# Altium footprint library NES-Footprints.PcbLib: 92 footprints (part 6 of 6)
Each footprint in its own frame and in the unit in brackets; x right, y up, seen from the top. Pads: shape width x height; smd on the part's side, far side on the other; paste and mask are expansions set on the pad; w line width, h text height; cw(c..) or ccw(c..) is an arc to the next point about the centre after c.
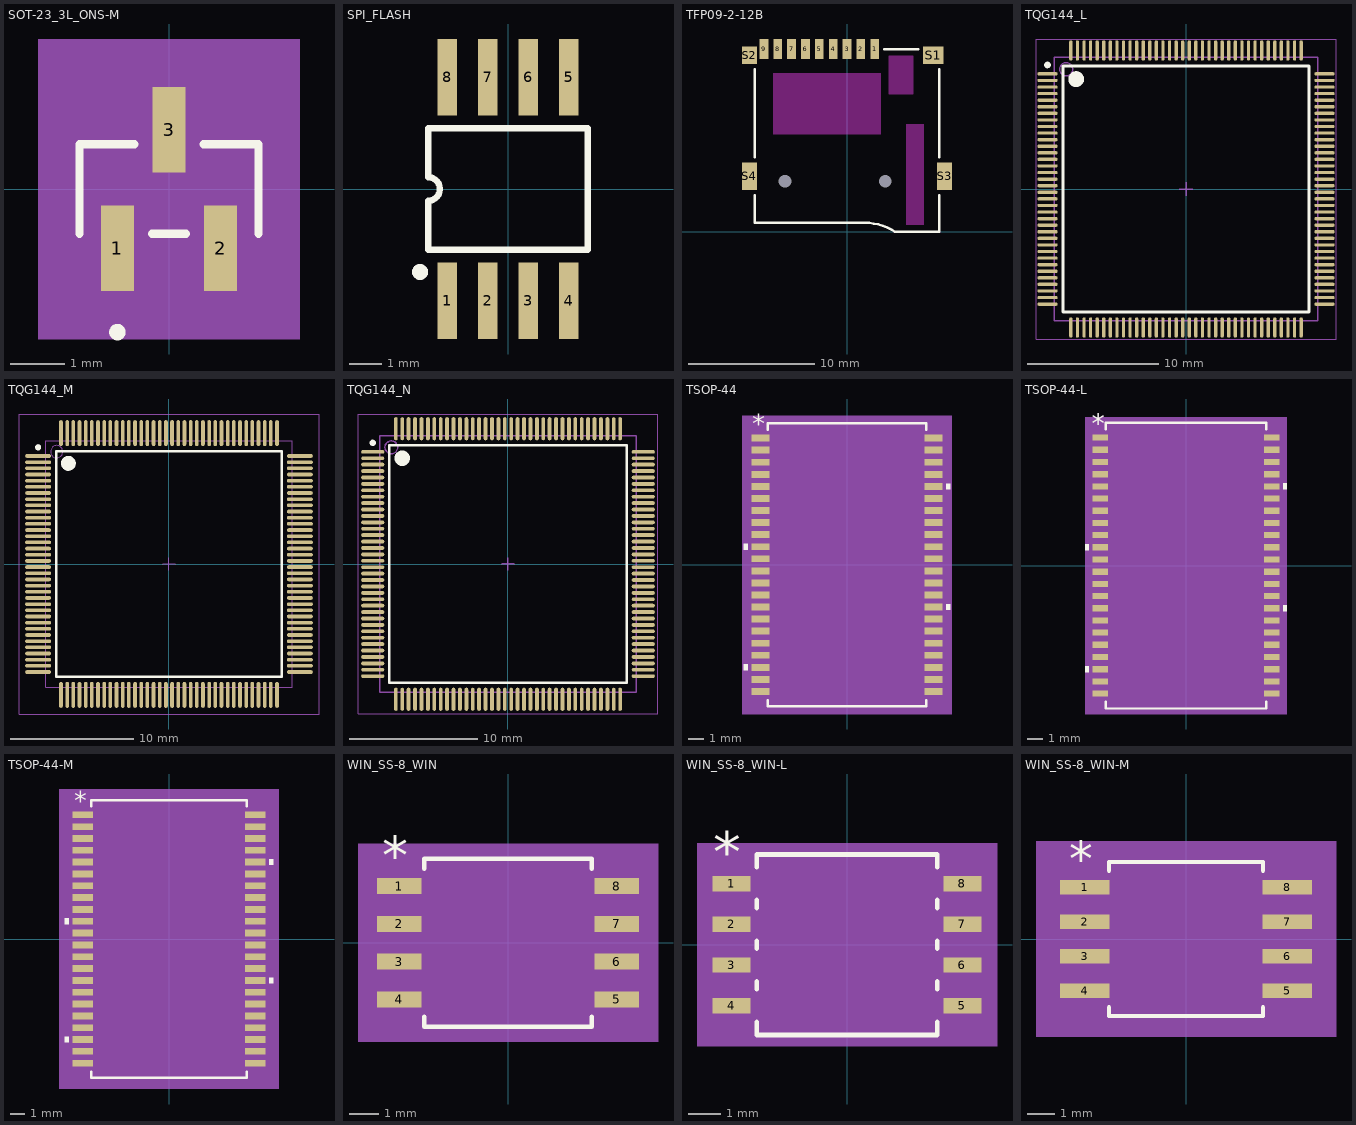
[diagram p5: the footprints below, top view; thin cyan lines are the x and y axes]

## SOT-23_3L_ONS-M [mil]
pads (3):
  rect 24x62 smd paste+0 mask+0: 1(-37.5,-43) 2(37.5,-43) 3(0,43)
Top Overlay:
  circle w6: c-37.5,-104 r3
  lines w6: -65,-32.5 -65,32.5 -25.1,32.5 ; -12.4,-32.5 12.4,-32.5 ; 25.1,32.5 65,32.5 65,-32.5
Mechanical 5:
  region: -95,109 95,109 95,-109 -95,-109
Mechanical 13:
  circle w0: c-37.5,-17.5 r3
  lines w1: -60,-27.5 -60,27.5 60,27.5 60,-27.5 -60,-27.5 ; -47.5,-52 -27.5,-52 -27.5,-27.5 -47.5,-27.5 -47.5,-52 ; -10,27.5 -10,52 10,52 10,27.5 -10,27.5 ; 27.5,-52 47.5,-52 47.5,-27.5 27.5,-27.5 27.5,-52
Mechanical 15:
  region: -80,-47.5 -80,47.5 -30,47.5 -30,94 30,94 30,47.5 80,47.5 80,-47.5 67.5,-47.5 67.5,-94 -67.5,-94 -67.5,-47.5
  lines w6: -80,-47.5 -67.5,-47.5 -67.5,-94 67.5,-94 67.5,-47.5 80,-47.5 80,47.5 30,47.5 30,94 -30,94 -30,47.5 -80,47.5 -80,-47.5
3D body "SOT-23_3L_ONS.step": height 44.09, standoff 0, extent -60,-52.01 60,52.01

## SPI_FLASH [mm] "Small Outline; 8 Leads; Body Width 3.9 mm; Pitch 1.27 mm"
height 1.75
pads (8):
  rect 0.6x2.4 smd: 1(-1.905,-3.5) 2(-0.635,-3.5) 3(0.635,-3.5) 4(1.905,-3.5) 5(1.905,3.5) 6(0.635,3.5) 7(-0.635,3.5) 8(-1.905,3.5)
Top Overlay:
  circle w0.25: c-2.755,-2.6 r0.125
  lines w0.2: -2.5,-1.9 2.5,-1.9 2.5,1.9 -2.5,1.9 -2.5,0.367 cw(c-2.5,0) -2.5,-0.367 -2.5,-1.9

## TFP09-2-12B [mm] "MicroSD card socket"
pads (15):
  rect 0.7x1.6 smd: 1(2.2,14.5) 2(1.1,14.5) 3(0,14.5) 4(-1.1,14.5) 5(-2.2,14.5) 6(-3.3,14.5) 7(-4.4,14.5) 8(-5.5,14.5) 9(-6.6,14.5)
  rect 0x0 hole 1 unplated: MH1(3.05,4) MH2(-4.93,4)
  rect 1.6x1.4 smd: S1(6.85,14)
  rect 1.2x1.4 smd: S2(-7.75,14)
  rect 1.2x2.2 smd: S3(7.75,4.4) S4(-7.75,4.4)
Top Layer keep-out:
  rectangle: -5.9,7.7 2.7,12.6
  rectangle: 3.3,10.9 5.3,14
  rectangle: 4.7,0.5 6.1,8.55
Top Overlay:
  lines w0.2: -7.35,2.9 -7.35,0.7 1,0.7 1.405,0.7 cw(c1.354,-3.92) 3.8,0 7.35,0 7.35,2.9 ; -7.35,5.9 -7.35,12.9 ; 2.95,14.5 5.65,14.5 ; 7.35,5.9 7.35,12.9
3D body "XKXFS-N02-XXT.STEP": height 1.86, standoff -0.54, extent -8.2,0 8.2,15

## TQG144_L [mm] "Thin QFP, 144-Leads, Body 20x20mm, Pitch 0.5mm, IPC High Density"
height 1.6
pads (144):
  oval 1.55x0.25 smd: 1(-10.525,8.75) 2(-10.525,8.25) 3(-10.525,7.75) 4(-10.525,7.25) 5(-10.525,6.75) 6(-10.525,6.25) 7(-10.525,5.75) 8(-10.525,5.25) 9(-10.525,4.75) 10(-10.525,4.25) 11(-10.525,3.75) 12(-10.525,3.25) 13(-10.525,2.75) 14(-10.525,2.25) 15(-10.525,1.75) 16(-10.525,1.25) 17(-10.525,0.75) 18(-10.525,0.25) 19(-10.525,-0.25) 20(-10.525,-0.75) 21(-10.525,-1.25) 22(-10.525,-1.75) 23(-10.525,-2.25) 24(-10.525,-2.75) 25(-10.525,-3.25) 26(-10.525,-3.75) 27(-10.525,-4.25) 28(-10.525,-4.75) 29(-10.525,-5.25) 30(-10.525,-5.75) 31(-10.525,-6.25) 32(-10.525,-6.75) 33(-10.525,-7.25) 34(-10.525,-7.75) 35(-10.525,-8.25) 36(-10.525,-8.75) 73(10.525,-8.75) 74(10.525,-8.25) 75(10.525,-7.75) 76(10.525,-7.25) 77(10.525,-6.75) 78(10.525,-6.25) 79(10.525,-5.75) 80(10.525,-5.25) 81(10.525,-4.75) 82(10.525,-4.25) 83(10.525,-3.75) 84(10.525,-3.25) 85(10.525,-2.75) 86(10.525,-2.25) 87(10.525,-1.75) 88(10.525,-1.25) 89(10.525,-0.75) 90(10.525,-0.25) 91(10.525,0.25) 92(10.525,0.75) 93(10.525,1.25) 94(10.525,1.75) 95(10.525,2.25) 96(10.525,2.75) 97(10.525,3.25) 98(10.525,3.75) 99(10.525,4.25) 100(10.525,4.75) 101(10.525,5.25) 102(10.525,5.75) 103(10.525,6.25) 104(10.525,6.75) 105(10.525,7.25) 106(10.525,7.75) 107(10.525,8.25) 108(10.525,8.75)
  oval 0.25x1.55 smd: 37(-8.75,-10.525) 38(-8.25,-10.525) 39(-7.75,-10.525) 40(-7.25,-10.525) 41(-6.75,-10.525) 42(-6.25,-10.525) 43(-5.75,-10.525) 44(-5.25,-10.525) 45(-4.75,-10.525) 46(-4.25,-10.525) 47(-3.75,-10.525) 48(-3.25,-10.525) 49(-2.75,-10.525) 50(-2.25,-10.525) 51(-1.75,-10.525) 52(-1.25,-10.525) 53(-0.75,-10.525) 54(-0.25,-10.525) 55(0.25,-10.525) 56(0.75,-10.525) 57(1.25,-10.525) 58(1.75,-10.525) 59(2.25,-10.525) 60(2.75,-10.525) 61(3.25,-10.525) 62(3.75,-10.525) 63(4.25,-10.525) 64(4.75,-10.525) 65(5.25,-10.525) 66(5.75,-10.525) 67(6.25,-10.525) 68(6.75,-10.525) 69(7.25,-10.525) 70(7.75,-10.525) 71(8.25,-10.525) 72(8.75,-10.525) 109(8.75,10.525) 110(8.25,10.525) 111(7.75,10.525) 112(7.25,10.525) 113(6.75,10.525) 114(6.25,10.525) 115(5.75,10.525) 116(5.25,10.525) 117(4.75,10.525) 118(4.25,10.525) 119(3.75,10.525) 120(3.25,10.525) 121(2.75,10.525) 122(2.25,10.525) 123(1.75,10.525) 124(1.25,10.525) 125(0.75,10.525) 126(0.25,10.525) 127(-0.25,10.525) 128(-0.75,10.525) 129(-1.25,10.525) 130(-1.75,10.525) 131(-2.25,10.525) 132(-2.75,10.525) 133(-3.25,10.525) 134(-3.75,10.525) 135(-4.25,10.525) 136(-4.75,10.525) 137(-5.25,10.525) 138(-5.75,10.525) 139(-6.25,10.525) 140(-6.75,10.525) 141(-7.25,10.525) 142(-7.75,10.525) 143(-8.25,10.525) 144(-8.75,10.525)
Top Overlay:
  circle w0.25: c-10.525,9.425 r0.125
  circle w0.6: c-8.35,8.35 r0.3
  lines w0.2: -9.35,-9.35 -9.35,9.35 9.35,9.35 9.35,-9.35 -9.35,-9.35
Mechanical 13:
  circle w0.1: c-9.1,9.1 r0.5
  lines w0.1: -10,-10 -10,10 10,10 10,-10 -10,-10
Mechanical 15:
  lines w0.05: -11.4,-11.4 -11.4,11.4 11.4,11.4 11.4,-11.4 -11.4,-11.4
  lines w0.1: -0.5,0 0.5,0 ; 0,-0.5 0,0.5
3D body: height 1.6, standoff 0, extent -10,-10 10,10

## TQG144_M [mm] "Thin QFP, 144-Leads, Body 20x20mm, Pitch 0.5mm, IPC Low Density"
height 1.6
pads (144):
  oval 2.1x0.3 smd: 1(-10.6,8.75) 2(-10.6,8.25) 3(-10.6,7.75) 4(-10.6,7.25) 5(-10.6,6.75) 6(-10.6,6.25) 7(-10.6,5.75) 8(-10.6,5.25) 9(-10.6,4.75) 10(-10.6,4.25) 11(-10.6,3.75) 12(-10.6,3.25) 13(-10.6,2.75) 14(-10.6,2.25) 15(-10.6,1.75) 16(-10.6,1.25) 17(-10.6,0.75) 18(-10.6,0.25) 19(-10.6,-0.25) 20(-10.6,-0.75) 21(-10.6,-1.25) 22(-10.6,-1.75) 23(-10.6,-2.25) 24(-10.6,-2.75) 25(-10.6,-3.25) 26(-10.6,-3.75) 27(-10.6,-4.25) 28(-10.6,-4.75) 29(-10.6,-5.25) 30(-10.6,-5.75) 31(-10.6,-6.25) 32(-10.6,-6.75) 33(-10.6,-7.25) 34(-10.6,-7.75) 35(-10.6,-8.25) 36(-10.6,-8.75) 73(10.6,-8.75) 74(10.6,-8.25) 75(10.6,-7.75) 76(10.6,-7.25) 77(10.6,-6.75) 78(10.6,-6.25) 79(10.6,-5.75) 80(10.6,-5.25) 81(10.6,-4.75) 82(10.6,-4.25) 83(10.6,-3.75) 84(10.6,-3.25) 85(10.6,-2.75) 86(10.6,-2.25) 87(10.6,-1.75) 88(10.6,-1.25) 89(10.6,-0.75) 90(10.6,-0.25) 91(10.6,0.25) 92(10.6,0.75) 93(10.6,1.25) 94(10.6,1.75) 95(10.6,2.25) 96(10.6,2.75) 97(10.6,3.25) 98(10.6,3.75) 99(10.6,4.25) 100(10.6,4.75) 101(10.6,5.25) 102(10.6,5.75) 103(10.6,6.25) 104(10.6,6.75) 105(10.6,7.25) 106(10.6,7.75) 107(10.6,8.25) 108(10.6,8.75)
  oval 0.3x2.1 smd: 37(-8.75,-10.6) 38(-8.25,-10.6) 39(-7.75,-10.6) 40(-7.25,-10.6) 41(-6.75,-10.6) 42(-6.25,-10.6) 43(-5.75,-10.6) 44(-5.25,-10.6) 45(-4.75,-10.6) 46(-4.25,-10.6) 47(-3.75,-10.6) 48(-3.25,-10.6) 49(-2.75,-10.6) 50(-2.25,-10.6) 51(-1.75,-10.6) 52(-1.25,-10.6) 53(-0.75,-10.6) 54(-0.25,-10.6) 55(0.25,-10.6) 56(0.75,-10.6) 57(1.25,-10.6) 58(1.75,-10.6) 59(2.25,-10.6) 60(2.75,-10.6) 61(3.25,-10.6) 62(3.75,-10.6) 63(4.25,-10.6) 64(4.75,-10.6) 65(5.25,-10.6) 66(5.75,-10.6) 67(6.25,-10.6) 68(6.75,-10.6) 69(7.25,-10.6) 70(7.75,-10.6) 71(8.25,-10.6) 72(8.75,-10.6) 109(8.75,10.6) 110(8.25,10.6) 111(7.75,10.6) 112(7.25,10.6) 113(6.75,10.6) 114(6.25,10.6) 115(5.75,10.6) 116(5.25,10.6) 117(4.75,10.6) 118(4.25,10.6) 119(3.75,10.6) 120(3.25,10.6) 121(2.75,10.6) 122(2.25,10.6) 123(1.75,10.6) 124(1.25,10.6) 125(0.75,10.6) 126(0.25,10.6) 127(-0.25,10.6) 128(-0.75,10.6) 129(-1.25,10.6) 130(-1.75,10.6) 131(-2.25,10.6) 132(-2.75,10.6) 133(-3.25,10.6) 134(-3.75,10.6) 135(-4.25,10.6) 136(-4.75,10.6) 137(-5.25,10.6) 138(-5.75,10.6) 139(-6.25,10.6) 140(-6.75,10.6) 141(-7.25,10.6) 142(-7.75,10.6) 143(-8.25,10.6) 144(-8.75,10.6)
Top Overlay:
  circle w0.25: c-10.6,9.45 r0.125
  circle w0.6: c-8.15,8.15 r0.3
  lines w0.2: -9.15,-9.15 -9.15,9.15 9.15,9.15 9.15,-9.15 -9.15,-9.15
Mechanical 13:
  circle w0.1: c-9.1,9.1 r0.5
  lines w0.1: -10,-10 -10,10 10,10 10,-10 -10,-10
Mechanical 15:
  lines w0.05: -12.15,-12.15 -12.15,12.15 12.15,12.15 12.15,-12.15 -12.15,-12.15
  lines w0.1: -0.5,0 0.5,0 ; 0,-0.5 0,0.5
3D body: height 1.6, standoff 0, extent -10,-10 10,10

## TQG144_N [mm] "Thin QFP, 144-Leads, Body 20x20mm, Pitch 0.5mm, IPC Medium Density"
height 1.6
pads (144):
  oval 1.8x0.3 smd: 1(-10.55,8.75) 2(-10.55,8.25) 3(-10.55,7.75) 4(-10.55,7.25) 5(-10.55,6.75) 6(-10.55,6.25) 7(-10.55,5.75) 8(-10.55,5.25) 9(-10.55,4.75) 10(-10.55,4.25) 11(-10.55,3.75) 12(-10.55,3.25) 13(-10.55,2.75) 14(-10.55,2.25) 15(-10.55,1.75) 16(-10.55,1.25) 17(-10.55,0.75) 18(-10.55,0.25) 19(-10.55,-0.25) 20(-10.55,-0.75) 21(-10.55,-1.25) 22(-10.55,-1.75) 23(-10.55,-2.25) 24(-10.55,-2.75) 25(-10.55,-3.25) 26(-10.55,-3.75) 27(-10.55,-4.25) 28(-10.55,-4.75) 29(-10.55,-5.25) 30(-10.55,-5.75) 31(-10.55,-6.25) 32(-10.55,-6.75) 33(-10.55,-7.25) 34(-10.55,-7.75) 35(-10.55,-8.25) 36(-10.55,-8.75) 73(10.55,-8.75) 74(10.55,-8.25) 75(10.55,-7.75) 76(10.55,-7.25) 77(10.55,-6.75) 78(10.55,-6.25) 79(10.55,-5.75) 80(10.55,-5.25) 81(10.55,-4.75) 82(10.55,-4.25) 83(10.55,-3.75) 84(10.55,-3.25) 85(10.55,-2.75) 86(10.55,-2.25) 87(10.55,-1.75) 88(10.55,-1.25) 89(10.55,-0.75) 90(10.55,-0.25) 91(10.55,0.25) 92(10.55,0.75) 93(10.55,1.25) 94(10.55,1.75) 95(10.55,2.25) 96(10.55,2.75) 97(10.55,3.25) 98(10.55,3.75) 99(10.55,4.25) 100(10.55,4.75) 101(10.55,5.25) 102(10.55,5.75) 103(10.55,6.25) 104(10.55,6.75) 105(10.55,7.25) 106(10.55,7.75) 107(10.55,8.25) 108(10.55,8.75)
  oval 0.3x1.8 smd: 37(-8.75,-10.55) 38(-8.25,-10.55) 39(-7.75,-10.55) 40(-7.25,-10.55) 41(-6.75,-10.55) 42(-6.25,-10.55) 43(-5.75,-10.55) 44(-5.25,-10.55) 45(-4.75,-10.55) 46(-4.25,-10.55) 47(-3.75,-10.55) 48(-3.25,-10.55) 49(-2.75,-10.55) 50(-2.25,-10.55) 51(-1.75,-10.55) 52(-1.25,-10.55) 53(-0.75,-10.55) 54(-0.25,-10.55) 55(0.25,-10.55) 56(0.75,-10.55) 57(1.25,-10.55) 58(1.75,-10.55) 59(2.25,-10.55) 60(2.75,-10.55) 61(3.25,-10.55) 62(3.75,-10.55) 63(4.25,-10.55) 64(4.75,-10.55) 65(5.25,-10.55) 66(5.75,-10.55) 67(6.25,-10.55) 68(6.75,-10.55) 69(7.25,-10.55) 70(7.75,-10.55) 71(8.25,-10.55) 72(8.75,-10.55) 109(8.75,10.55) 110(8.25,10.55) 111(7.75,10.55) 112(7.25,10.55) 113(6.75,10.55) 114(6.25,10.55) 115(5.75,10.55) 116(5.25,10.55) 117(4.75,10.55) 118(4.25,10.55) 119(3.75,10.55) 120(3.25,10.55) 121(2.75,10.55) 122(2.25,10.55) 123(1.75,10.55) 124(1.25,10.55) 125(0.75,10.55) 126(0.25,10.55) 127(-0.25,10.55) 128(-0.75,10.55) 129(-1.25,10.55) 130(-1.75,10.55) 131(-2.25,10.55) 132(-2.75,10.55) 133(-3.25,10.55) 134(-3.75,10.55) 135(-4.25,10.55) 136(-4.75,10.55) 137(-5.25,10.55) 138(-5.75,10.55) 139(-6.25,10.55) 140(-6.75,10.55) 141(-7.25,10.55) 142(-7.75,10.55) 143(-8.25,10.55) 144(-8.75,10.55)
Top Overlay:
  circle w0.25: c-10.55,9.45 r0.125
  circle w0.6: c-8.25,8.25 r0.3
  lines w0.2: -9.25,-9.25 -9.25,9.25 9.25,9.25 9.25,-9.25 -9.25,-9.25
Mechanical 13:
  circle w0.1: c-9.1,9.1 r0.5
  lines w0.1: -10,-10 -10,10 10,10 10,-10 -10,-10
Mechanical 15:
  lines w0.05: -11.7,-11.7 -11.7,11.7 11.7,11.7 11.7,-11.7 -11.7,-11.7
  lines w0.1: -0.5,0 0.5,0 ; 0,-0.5 0,0.5
3D body: height 1.6, standoff 0, extent -10,-10 10,10

## TSOP-44 [mil]
pads (44):
  rect 47x18 smd paste+0 mask+0: 1(-225.5,330.75) 2(-225.5,299.25) 3(-225.5,267.75) 4(-225.5,236.25) 5(-225.5,204.75) 6(-225.5,173.25) 7(-225.5,141.75) 8(-225.5,110.25) 9(-225.5,78.75) 10(-225.5,47.25) 11(-225.5,15.75) 12(-225.5,-15.75) 13(-225.5,-47.25) 14(-225.5,-78.75) 15(-225.5,-110.25) 16(-225.5,-141.75) 17(-225.5,-173.25) 18(-225.5,-204.75) 19(-225.5,-236.25) 20(-225.5,-267.75) 21(-225.5,-299.25) 22(-225.5,-330.75) 23(225.5,-330.75) 24(225.5,-299.25) 25(225.5,-267.75) 26(225.5,-236.25) 27(225.5,-204.75) 28(225.5,-173.25) 29(225.5,-141.75) 30(225.5,-110.25) 31(225.5,-78.75) 32(225.5,-47.25) 33(225.5,-15.75) 34(225.5,15.75) 35(225.5,47.25) 36(225.5,78.75) 37(225.5,110.25) 38(225.5,141.75) 39(225.5,173.25) 40(225.5,204.75) 41(225.5,236.25) 42(225.5,267.75) 43(225.5,299.25) 44(225.5,330.75)
Top Overlay:
  region: 259,212.25 269,212.25 269,197.25 259,197.25
  region: 259,-102.75 269,-102.75 269,-117.75 259,-117.75
  region: -259,-260.25 -269,-260.25 -269,-275.25 -259,-275.25
  region: -259,54.75 -269,54.75 -269,39.75 -259,39.75
  lines w6: -207,-352.85 -207,-369.5 207,-369.5 207,-352.85 ; -207,352.85 -207,369.5 207,369.5 207,352.85
  text "*" at -248,343.75 h50
Mechanical 5:
  region: 274,-389.5 -274,-389.5 -274,389.5 274,389.5
Mechanical 13:
  drawing of 181 lines, arcs and shapes, not listed
  text "*" at -199.5,311.5 h50
Mechanical 15:
  region: -212,-349.75 -259,-349.75 -259,349.75 -212,349.75 -212,374.5 212,374.5 212,349.75 259,349.75 259,-349.75 212,-349.75 212,-374.5 -212,-374.5
  lines w6: -259,-349.75 -212,-349.75 -212,-374.5 212,-374.5 212,-349.75 259,-349.75 259,349.75 212,349.75 212,374.5 -212,374.5 -212,349.75 -259,349.75 -259,-349.75
3D body "TSOP-44.step": height 47.09, standoff 0, extent -235,-364.49 235,364.49

## TSOP-44-L [mil]
pads (44):
  rect 39x16 smd paste+0 mask+0: 1(-221.5,330.75) 2(-221.5,299.25) 3(-221.5,267.75) 4(-221.5,236.25) 5(-221.5,204.75) 6(-221.5,173.25) 7(-221.5,141.75) 8(-221.5,110.25) 9(-221.5,78.75) 10(-221.5,47.25) 11(-221.5,15.75) 12(-221.5,-15.75) 13(-221.5,-47.25) 14(-221.5,-78.75) 15(-221.5,-110.25) 16(-221.5,-141.75) 17(-221.5,-173.25) 18(-221.5,-204.75) 19(-221.5,-236.25) 20(-221.5,-267.75) 21(-221.5,-299.25) 22(-221.5,-330.75) 23(221.5,-330.75) 24(221.5,-299.25) 25(221.5,-267.75) 26(221.5,-236.25) 27(221.5,-204.75) 28(221.5,-173.25) 29(221.5,-141.75) 30(221.5,-110.25) 31(221.5,-78.75) 32(221.5,-47.25) 33(221.5,-15.75) 34(221.5,15.75) 35(221.5,47.25) 36(221.5,78.75) 37(221.5,110.25) 38(221.5,141.75) 39(221.5,173.25) 40(221.5,204.75) 41(221.5,236.25) 42(221.5,267.75) 43(221.5,299.25) 44(221.5,330.75)
Top Overlay:
  region: -251,54.75 -261,54.75 -261,39.75 -251,39.75
  region: -251,-260.25 -261,-260.25 -261,-275.25 -251,-275.25
  region: 251,-102.75 261,-102.75 261,-117.75 251,-117.75
  region: 251,212.25 261,212.25 261,197.25 251,197.25
  lines w6: -207,-351.85 -207,-369.5 207,-369.5 207,-351.85 ; -207,351.85 -207,369.5 207,369.5 207,351.85
  text "*" at -244,341.75 h50
Mechanical 5:
  region: 260,-383.5 -260,-383.5 -260,383.5 260,383.5
Mechanical 13:
  drawing of 181 lines, arcs and shapes, not listed
  text "*" at -199.5,311.5 h50
Mechanical 15:
  region: -206,-342.75 -245,-342.75 -245,342.75 -206,342.75 -206,368.5 206,368.5 206,342.75 245,342.75 245,-342.75 206,-342.75 206,-368.5 -206,-368.5
  lines w6: -245,-342.75 -245,342.75 -206,342.75 -206,368.5 206,368.5 206,342.75 245,342.75 245,-342.75 206,-342.75 206,-368.5 -206,-368.5 -206,-342.75 -245,-342.75
3D body "TSOP-44.step": height 47.09, standoff 0, extent -235,-364.49 235,364.49

## TSOP-44-M [mil]
pads (44):
  rect 55x18 smd paste+0 mask+0: 1(-229.5,330.75) 2(-229.5,299.25) 3(-229.5,267.75) 4(-229.5,236.25) 5(-229.5,204.75) 6(-229.5,173.25) 7(-229.5,141.75) 8(-229.5,110.25) 9(-229.5,78.75) 10(-229.5,47.25) 11(-229.5,15.75) 12(-229.5,-15.75) 13(-229.5,-47.25) 14(-229.5,-78.75) 15(-229.5,-110.25) 16(-229.5,-141.75) 17(-229.5,-173.25) 18(-229.5,-204.75) 19(-229.5,-236.25) 20(-229.5,-267.75) 21(-229.5,-299.25) 22(-229.5,-330.75) 23(229.5,-330.75) 24(229.5,-299.25) 25(229.5,-267.75) 26(229.5,-236.25) 27(229.5,-204.75) 28(229.5,-173.25) 29(229.5,-141.75) 30(229.5,-110.25) 31(229.5,-78.75) 32(229.5,-47.25) 33(229.5,-15.75) 34(229.5,15.75) 35(229.5,47.25) 36(229.5,78.75) 37(229.5,110.25) 38(229.5,141.75) 39(229.5,173.25) 40(229.5,204.75) 41(229.5,236.25) 42(229.5,267.75) 43(229.5,299.25) 44(229.5,330.75)
Top Overlay:
  region: 267,212.25 277,212.25 277,197.25 267,197.25
  region: 267,-102.75 277,-102.75 277,-117.75 267,-117.75
  region: -267,-260.25 -277,-260.25 -277,-275.25 -267,-275.25
  region: -267,54.75 -277,54.75 -277,39.75 -267,39.75
  lines w6: -207,-352.85 -207,-369.5 207,-369.5 207,-352.85 ; -207,352.85 -207,369.5 207,369.5 207,352.85
  text "*" at -252,343.75 h50
Mechanical 5:
  region: 292,-399.5 -292,-399.5 -292,399.5 292,399.5
Mechanical 13:
  drawing of 181 lines, arcs and shapes, not listed
  text "*" at -199.5,311.5 h50
Mechanical 15:
  region: -222,-359.75 -277,-359.75 -277,359.75 -222,359.75 -222,384.5 222,384.5 222,359.75 277,359.75 277,-359.75 222,-359.75 222,-384.5 -222,-384.5
  lines w6: -277,-359.75 -222,-359.75 -222,-384.5 222,-384.5 222,-359.75 277,-359.75 277,359.75 222,359.75 222,384.5 -222,384.5 -222,359.75 -277,359.75 -277,-359.75
3D body "TSOP-44.step": height 47.09, standoff 0, extent -235,-364.49 235,364.49

## WIN_SS-8_WIN [mil]
pads (8):
  rect 59x21 smd paste+0 mask+0: 1(-144,75) 2(-144,25) 3(-144,-25) 4(-144,-75) 5(144,-75) 6(144,-25) 7(144,25) 8(144,75)
Top Overlay:
  lines w6: -111,-98.12 -111,-111 111,-111 111,-98.12 ; -111,98.12 -111,111 111,111 111,98.12
  text "*" at -166.5,91 h50
Mechanical 5:
  region: 198.5,-131 -198.5,-131 -198.5,131 198.5,131
Mechanical 13:
  lines w0: -12,106 ccw(c0,106) 12,106
  lines w1: -159.5,-84.5 -106,-84.5 -106,-65.5 -159.5,-65.5 -159.5,-84.5 ; -159.5,-34.5 -106,-34.5 -106,-15.5 -159.5,-15.5 -159.5,-34.5 ; -159.5,15.5 -106,15.5 -106,34.5 -159.5,34.5 -159.5,15.5 ; -159.5,65.5 -106,65.5 -106,84.5 -159.5,84.5 -159.5,65.5 ; -106,-106 -106,106 106,106 106,-106 -106,-106 ; 106,-84.5 159.5,-84.5 159.5,-65.5 106,-65.5 106,-84.5 ; 106,-34.5 159.5,-34.5 159.5,-15.5 106,-15.5 106,-34.5 ; 106,15.5 159.5,15.5 159.5,34.5 106,34.5 106,15.5 ; 106,65.5 159.5,65.5 159.5,84.5 106,84.5 106,65.5
  text "*" at -103.5,53 h50
Mechanical 15:
  region: -116,-95.5 -183.5,-95.5 -183.5,95.5 -116,95.5 -116,116 116,116 116,95.5 183.5,95.5 183.5,-95.5 116,-95.5 116,-116 -116,-116
  lines w6: -183.5,-95.5 -116,-95.5 -116,-116 116,-116 116,-95.5 183.5,-95.5 183.5,95.5 116,95.5 116,116 -116,116 -116,95.5 -183.5,95.5 -183.5,-95.5
3D body "WIN_SS-8_WIN.step": height 85.12, standoff 0, extent -159.49,-105.98 159.49,105.98

## WIN_SS-8_WIN-L [mil]
pads (8):
  rect 47x19 smd paste+0 mask+0: 1(-142,75) 2(-142,25) 3(-142,-25) 4(-142,-75) 5(142,-75) 6(142,-25) 7(142,25) 8(142,75)
Top Overlay:
  lines w6: -111,-95.24 -111,-111 111,-111 111,-95.24 ; -111,-54.76 -111,-45.24 ; -111,-4.76 -111,4.76 ; -111,45.24 -111,54.76 ; -111,95.24 -111,111 111,111 111,95.24 ; 111,-54.76 111,-45.24 ; 111,-4.76 111,4.76 ; 111,45.24 111,54.76
  text "*" at -164.5,89 h50
Mechanical 5:
  region: 184.5,-125 -184.5,-125 -184.5,125 184.5,125
Mechanical 13:
  lines w0: -12,106 ccw(c0,106) 12,106
  lines w1: -159.5,-84.5 -106,-84.5 -106,-65.5 -159.5,-65.5 -159.5,-84.5 ; -159.5,-34.5 -106,-34.5 -106,-15.5 -159.5,-15.5 -159.5,-34.5 ; -159.5,15.5 -106,15.5 -106,34.5 -159.5,34.5 -159.5,15.5 ; -159.5,65.5 -106,65.5 -106,84.5 -159.5,84.5 -159.5,65.5 ; -106,-106 -106,106 106,106 106,-106 -106,-106 ; 106,-84.5 159.5,-84.5 159.5,-65.5 106,-65.5 106,-84.5 ; 106,-34.5 159.5,-34.5 159.5,-15.5 106,-15.5 106,-34.5 ; 106,15.5 159.5,15.5 159.5,34.5 106,34.5 106,15.5 ; 106,65.5 159.5,65.5 159.5,84.5 106,84.5 106,65.5
  text "*" at -103.5,53 h50
Mechanical 15:
  region: -110,-88.5 -169.5,-88.5 -169.5,88.5 -110,88.5 -110,110 110,110 110,88.5 169.5,88.5 169.5,-88.5 110,-88.5 110,-110 -110,-110
  lines w6: -169.5,-88.5 -110,-88.5 -110,-110 110,-110 110,-88.5 169.5,-88.5 169.5,88.5 110,88.5 110,110 -110,110 -110,88.5 -169.5,88.5 -169.5,-88.5
3D body "WIN_SS-8_WIN.step": height 85.12, standoff 0, extent -159.49,-105.98 159.49,105.98

## WIN_SS-8_WIN-M [mil]
pads (8):
  rect 71x21 smd paste+0 mask+0: 1(-146,75) 2(-146,25) 3(-146,-25) 4(-146,-75) 5(146,-75) 6(146,-25) 7(146,25) 8(146,75)
Top Overlay:
  lines w6: -111,-98.6 -111,-111 111,-111 111,-98.6 ; -111,98.6 -111,111 111,111 111,98.6
  text "*" at -168.5,91 h50
Mechanical 5:
  region: 216.5,-141 -216.5,-141 -216.5,141 216.5,141
Mechanical 13:
  lines w0: -12,106 ccw(c0,106) 12,106
  lines w1: -159.5,-84.5 -106,-84.5 -106,-65.5 -159.5,-65.5 -159.5,-84.5 ; -159.5,-34.5 -106,-34.5 -106,-15.5 -159.5,-15.5 -159.5,-34.5 ; -159.5,15.5 -106,15.5 -106,34.5 -159.5,34.5 -159.5,15.5 ; -159.5,65.5 -106,65.5 -106,84.5 -159.5,84.5 -159.5,65.5 ; -106,-106 -106,106 106,106 106,-106 -106,-106 ; 106,-84.5 159.5,-84.5 159.5,-65.5 106,-65.5 106,-84.5 ; 106,-34.5 159.5,-34.5 159.5,-15.5 106,-15.5 106,-34.5 ; 106,15.5 159.5,15.5 159.5,34.5 106,34.5 106,15.5 ; 106,65.5 159.5,65.5 159.5,84.5 106,84.5 106,65.5
  text "*" at -103.5,53 h50
Mechanical 15:
  region: -126,-105.5 -201.5,-105.5 -201.5,105.5 -126,105.5 -126,126 126,126 126,105.5 201.5,105.5 201.5,-105.5 126,-105.5 126,-126 -126,-126
  lines w6: -201.5,-105.5 -126,-105.5 -126,-126 126,-126 126,-105.5 201.5,-105.5 201.5,105.5 126,105.5 126,126 -126,126 -126,105.5 -201.5,105.5 -201.5,-105.5
3D body "WIN_SS-8_WIN.step": height 85.12, standoff 0, extent -159.49,-105.98 159.49,105.98